# Altium footprint library Footprint.PcbLib: 14 footprints
Each footprint in its own frame and in the unit in brackets; x right, y up, seen from the top. Pads: shape width x height; smd on the part's side, far side on the other; paste and mask are expansions set on the pad; w line width, h text height; cw(c..) or ccw(c..) is an arc to the next point about the centre after c.
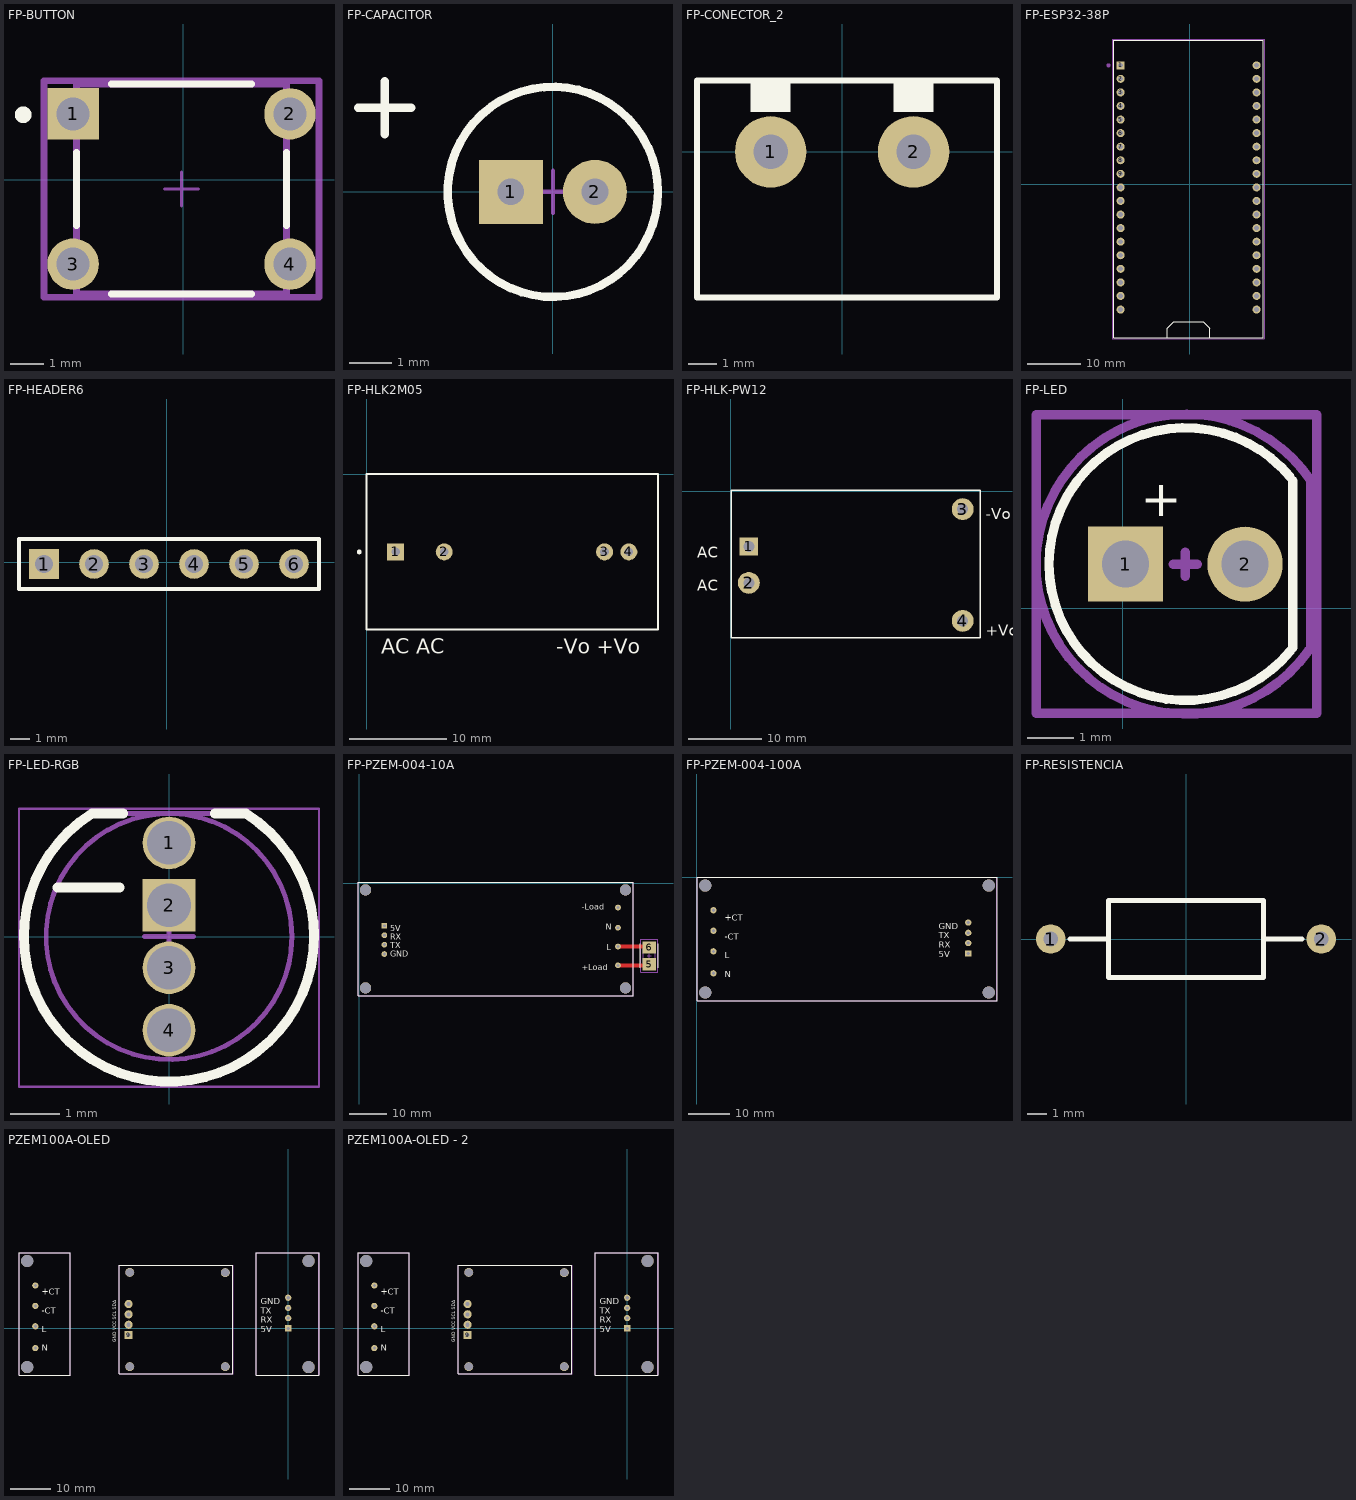
[diagram p0: the footprints below, top view; thin cyan lines are the x and y axes]

## FP-BUTTON [mm]
pads (4):
  rect 1.54x1.54 hole 0.99 paste-1000 mask+0: 1(-3.298,1.978)
  round 1.54 hole 0.99 paste-1000 mask+0: 2(3.202,1.978) 3(-3.298,-2.522) 4(3.202,-2.522)
Top Overlay:
  circle w0.25: c-4.793,1.953 r0.125
  lines w0.2: -3.193,-1.377 -3.193,0.833 ; -2.153,-3.417 2.057,-3.417 ; -2.153,2.873 2.057,2.873 ; 3.097,-1.377 3.097,0.833
Mechanical 5:
  lines w0.2: -4.168,-3.517 -4.168,2.973 4.072,2.973 4.072,-3.517 -4.168,-3.517
  text ".Designator" at -2.207,-0.084 h1
Mechanical 13:
  lines w0.2: -3.193,-3.417 -3.193,2.873 3.097,2.873 3.097,-3.417 -3.193,-3.417
Mechanical 15:
  lines w0.2: -4.168,-3.517 -4.168,2.973 4.072,2.973 4.072,-3.517 -4.168,-3.517
Mechanical 16:
  lines w0.1: -0.548,-0.272 0.452,-0.272 ; -0.048,-0.772 -0.048,0.228
3D body "Switch_TE_Connectivity_3-1825910-1_eec.STEP": height 0.25, standoff 0, extent -4.168,-3.517 4.072,2.973

## FP-CAPACITOR [mil]
pads (2):
  rect 60x60 hole 25: 1(-39.37,0)
  round 60 hole 25: 2(39.37,0)
Top Overlay:
  circle w7.87: c0,0 r98.43
  lines w7.87: -182.48,78.74 -132.48,78.74 ; -157.48,53.74 -157.48,103.74
Mechanical 13:
  circle w3.94: c0,0 r98.43
Mechanical 15:
  circle w1.97: c0,0 r98.43
  lines w3.94: -19.68,0 19.69,0 ; 0,-19.68 0,19.68
3D body "ElCapVT-2.0-5x7-black.step": height 275.63, standoff -118.11, extent -98.43,-98.41 98.46,98.41

## FP-CONECTOR_2 [mm]
pads (2):
  round 2.5 hole 1.2: 1(-2.5,0) 2(2.5,0)
Top Overlay:
  rectangle: 1.8,1.4 3.2,2.5
  rectangle: -3.2,1.4 -1.8,2.5
  lines w0.2: -5.08,-5.1 5.42,-5.1 5.42,2.5 -5.08,2.5 -5.08,-5.1
3D body "User Library-bornera-1.STEP": height 10, standoff -3.75, extent -5,-5.02 5.5,2.58

## FP-ESP32-38P [mm]
pads (38):
  rect 1.5x1.5 hole 0.9: 1(-12.967,22.255)
  round 1.5 hole 0.9: 2(-12.967,19.715) 3(-12.967,17.175) 4(-12.967,14.635) 5(-12.967,12.095) 6(-12.967,9.555) 7(-12.967,7.015) 8(-12.967,4.475) 9(-12.967,1.935) 10(-12.967,-0.605) 11(-12.967,-3.145) 12(-12.967,-5.685) 13(-12.967,-8.225) 14(-12.967,-10.765) 15(-12.967,-13.305) 16(-12.967,-15.845) 17(-12.967,-18.385) 18(-12.967,-20.925) 19(-12.967,-23.465) 20(12.483,-23.465) 21(12.483,-20.925) 22(12.483,-18.385) 23(12.483,-15.845) 24(12.483,-13.305) 25(12.483,-10.765) 26(12.483,-8.225) 27(12.483,-5.685) 28(12.483,-3.145) 29(12.483,-0.605) 30(12.483,1.935) 31(12.483,4.475) 32(12.483,7.015) 33(12.483,9.555) 34(12.483,12.095) 35(12.483,14.635) 36(12.483,17.175) 37(12.483,19.715) 38(12.483,22.255)
Top Overlay:
  lines w0.127: -14.22,-28.73 -14.22,26.94 ; -14.22,26.95 13.69,26.95 13.72,26.92 13.72,-28.73 ; -14.2,-28.73 13.7,-28.73 ; -4.25,-28.75 -4.25,-27 -3,-25.75 2.5,-25.75 3.75,-27 3.75,-28.75
Mechanical 13:
  circle w0.48: c-15.25,22.25 r0.14
Mechanical 15:
  lines w0.05: -14.47,-28.98 -14.47,27.17 13.93,27.17 ; -14.45,-28.98 13.95,-28.98 13.95,27.17
3D body "Goouuu-ESP32 Development Board.STEP": height 8.6, standoff -4.54, extent -14.22,-28.73 13.72,26.85

## FP-HEADER6 [mm]
pads (6):
  rect 1.5x1.5 hole 0.9: 1(-6.224,-0.096)
  round 1.5 hole 0.9: 2(-3.684,-0.096) 3(-1.144,-0.096) 4(1.396,-0.096) 5(3.936,-0.096) 6(6.476,-0.096)
Top Overlay:
  lines w0.2: -7.494,-1.366 -7.494,1.174 7.746,1.174 7.746,-1.366 -7.494,-1.366
3D body "female header.stp": height 5, standoff -3, extent -7.744,-1.366 7.996,1.134

## FP-HLK2M05 [mm]
pads (4):
  rect 1.75x1.75 hole 0.9: 1(3,-8)
  round 1.75 hole 0.9: 2(8,-8) 3(24.5,-8) 4(27,-8)
Top Overlay:
  circle w0.25: c-0.75,-8 r0.125
  lines w0.2: 0,-16 30,-16 30,0 0,0 0,-16
  text "AC AC" at 1.504,-18.496 h1.52
  text "-Vo +Vo" at 19.504,-18.496 h1.52
3D body "HLK-2M05.stp": height 19.1, standoff -5, extent 0,-16 30,0

## FP-HLK-PW12 [mm]
pads (4):
  rect 2.5x2.5 hole 1.5: 1(2.475,-7.55)
  round 3 hole 1.5: 2(2.475,-12.55) 3(31.775,-2.45) 4(31.775,-17.75)
Top Overlay:
  lines w0.2: 0.05,-20.05 34.175,-20.05 34.175,0.125 0.05,0.125 0.05,-20.05
  text "-Vo /  /  /  /  /  /  / +Vo" at 34.95,-19.8 h1.52
  text "AC /  / AC" at -4.625,-13.65 h1.52
3D body "User Library-HLK-PM01.STEP": height 15.6, standoff -4.5, extent 0.175,-20.15 34.175,0.05

## FP-LED [mm]
pads (2):
  rect 1.6x1.6 hole 1: 1(0.064,0.937)
  round 1.6 hole 1: 2(2.604,0.937)
Top Overlay:
  lines w0.2: -1.136,2.457 cw(c1.334,0.937) 3.562,2.794 ; -1.035,2.609 ccw(c1.334,0.937) 3.573,-0.907 ; 3.62,-0.841 3.62,2.715
  text "+" at 0.382,1.956 h0.76
Mechanical 13:
  lines w0.2: -1.841,-2.238 -1.841,4.112 4.128,4.112 4.128,-2.238 -1.841,-2.238
Mechanical 15:
  lines w0.2: 1.08,0.937 1.588,0.937 ; 1.334,0.683 1.334,1.191 ; 3.95,-0.909 cw(c1.348,0.94) 4.001,2.715 4.001,-0.841
  text ".Designator" at 1.334,0.937 h0.76
  text "+" at 0.382,1.956 h0.76
3D body "LED 5mm Green.step": height 8.72, standoff -2.98, extent -1.566,-1.963 3.834,3.837

## FP-LED-RGB [mm]
pads (4):
  round 1.07 hole 0.889 paste+0: 1(0,1.905) 3(0,-0.635) 4(0,-1.905)
  rect 1.07x1.07 hole 0.889 paste+0: 2(0,0.635)
Top Overlay:
  lines w0.2: -2.27,1 -1,1 ; -0.93,2.5 -1.566,2.5 ccw(c0,0) 1.566,2.5 0.93,2.5
Mechanical 13:
  circle w0.1: c0,0 r2.5
  lines w0.1: -1.566,2.5 ccw(c0,0) 1.566,2.5 -1.566,2.5
Mechanical 15:
  lines w0.05: -3.05,-3.05 -3.05,2.6 3.05,2.6 3.05,-3.05 -3.05,-3.05
  lines w0.1: -0.5,0 0.5,0 ; 0,-0.5 0,0.5
3D body "CA GRB LED 5mm.STEP": height 10.6, standoff -23.6, extent -2.75,-2.75 2.75,2.375

## FP-PZEM-004-10A [mm]
pads (14):
  rect 1.524x1.524 hole 0.762: 1(6.65,-11.25)
  round 1.524 hole 0.762: 2(6.65,-13.75) 3(6.65,-16.25) 4(6.65,-18.75) 5(68.65,-21.75) 6(68.65,-16.75) 7(68.65,-11.75) 8(68.65,-6.4)
  rect 3.535x3.264 smd paste+0 mask+0: 5(76.924,-21.446) 6(76.924,-17.004)
  round 3 hole 3: ""(1.65,-27.75) ""(1.65,-1.74) ""(70.65,-27.75) ""(70.65,-1.74)
Top Layer:
  lines w1: 68.65,-21.75 76.728,-21.75 ; 68.65,-16.75 76.17,-16.75
Top Overlay:
  lines w0.2: 74.574,-22.4 74.574,-16.05 ; 79.274,-22.4 79.274,-16.05 ; -0.35,-29.75 72.65,-29.75 72.65,0.25 -0.35,0.25 -0.35,-29.75
  text "5V / RX / TX / GND" at 8.15,-19.5 h1.52
  text "N" at 65.4,-12.25 h1.52
  text "L" at 65.65,-17.75 h1.52
  text "-Load" at 59,-7 h1.52
  text "+Load" at 59,-23 h1.52
Mechanical 5:
  lines w0.2: -0.35,-29.75 -0.35,0.25 72.65,0.25 72.65,-29.75 -0.35,-29.75 ; 74.657,-23.577 79.191,-23.577 79.191,-14.873 74.657,-14.873 74.657,-23.577
  text ".Designator" at 76.736,-19.225 h1
Mechanical 13:
  lines w0.2: 75.334,-22.4 78.514,-22.4 78.514,-16.05 75.334,-16.05 75.334,-22.4
Mechanical 15:
  lines w0.2: 74.657,-23.577 79.191,-23.577 79.191,-14.873 74.657,-14.873 74.657,-23.577
Mechanical 16:
  lines w0.1: 76.424,-19.225 77.424,-19.225 ; 76.924,-19.725 76.924,-18.725
3D body "Res_Yageo_PA2512FKM7W0R001E_eec.STEP": height 0.25, standoff 0, extent 74.657,-23.577 79.191,-14.873
3D body "PZEM-004T-100A)V3.0).step": height 12.04, standoff -3.96, extent -0.35,-29.75 72.65,0.25

## FP-PZEM-004-100A [mm]
pads (12):
  rect 1.524x1.524 hole 0.762: 1(66.05,-18.575)
  round 1.524 hole 0.762: 2(66.05,-16.075) 3(66.05,-13.575) 4(66.05,-11.075) 5(4.05,-8.075) 6(4.05,-13.075) 7(4.05,-18.075) 8(4.05,-23.425)
  round 3 hole 3: ""(2.05,-28.085) ""(2.05,-2.075) ""(71.05,-28.085) ""(71.05,-2.075)
Top Overlay:
  lines w0.2: 0.05,-30.075 73.05,-30.075 73.05,-0.075 0.05,-0.075 0.05,-30.075
  text "GND / TX / RX / 5V" at 58.9,-19.5 h1.52
  text "+CT /  / -CT /  / L /  / N" at 6.75,-24.35 h1.52
Mechanical 5:
  lines w0.2: 0.05,-30.075 0.05,-0.075 73.05,-0.075 73.05,-30.075 0.05,-30.075
3D body "PZEM-004T-V3.step": height 16.3, standoff 0, extent -0.575,-30 73.425,0

## FP-RESISTENCIA [mil]
pads (2):
  round 60 hole 30: 1(-275.59,0) 2(275.59,0)
Top Overlay:
  lines w10: -236.22,0 -157.48,0 ; 157.48,0 236.22,0 ; -157.48,-78.74 -157.48,78.74 157.48,78.74 157.48,-78.74 -157.48,-78.74
3D body "RES-1W.STEP": height 183.17, standoff -92.42, extent -291.34,-78.74 291.34,78.74

## PZEM100A-OLED [mm]
pads (20):
  rect 1.524x1.524 hole 0.762: 1(0,0)
  round 1.524 hole 0.762: 2(0,2.5) 3(0,5) 4(0,7.5) 5(-62,10.5) 6(-62,5.5) 7(-62,0.5) 8(-62,-4.85)
  rect 2x2 hole 1: 9(-39.115,-1.64)
  round 2 hole 1: 10(-39.115,0.885) 11(-39.115,3.435) 12(-39.115,5.96)
  round 3 hole 3: ""(-64,-9.51) ""(-64,16.5) ""(5,-9.51) ""(5,16.5)
  round 2.2 hole 2: ""(-38.84,-9.39) ""(-38.84,13.71) ""(-15.415,-9.39) ""(-15.415,13.66)
Top Overlay:
  lines w0.2: -66,-11.5 -66,18.5 ; -53.4,-11.45 -53.4,18.55 ; -7.85,-11.5 -7.85,18.5 ; 7.55,-11.525 7.55,18.475 ; -41.42,-11.19 -41.42,15.51 -13.56,15.51 -13.56,-11.19 -41.42,-11.19
  lines w0.254: -66,-11.5 -53.45,-11.5 ; -66,18.5 -53.45,18.5 ; -7.85,-11.5 7.525,-11.5 ; -7.85,18.5 7.525,18.5
  text "+CT /  / -CT /  / L /  / N" at -60.45,-5.525 h1.52
  text "GND VCC SCL SDA" at -42.144,-3.411 h0.8
  text "GND / TX / RX / 5V" at -6.775,-0.95 h1.52
Mechanical 5:
  lines w0.2: -66,-11.5 -66,18.5 ; -53.4,-11.45 -53.4,18.55 ; -7.85,-11.5 -7.85,18.5 ; 7.55,-11.525 7.55,18.475
Mechanical 13:
  lines w0.254: -66,18.5 -66,-11.5 -66,-11.5 -53.45,-11.5 -53.4,-11.45 -53.4,18.55 -53.45,18.5 -65.75,18.5 ; 7.525,-11.5 -7.85,-11.5 -7.85,18.5 7.525,18.5 ; 7.55,-11.525 7.55,18.475 ; -41.42,-11.19 -41.42,15.51 -13.56,15.51 -13.5,15.45 -13.5,-11.13 -13.56,-11.19 -41.42,-11.19 ; -41.42,-11.19 -41.42,-11.19
3D body "OLED 128x64.STP": height 4.77, standoff -6.07, extent -41.42,-11.19 -13.56,15.51

## PZEM100A-OLED - 2 [mm]
pads (20):
  rect 1.524x1.524 hole 0.762: 1(0,0)
  round 1.524 hole 0.762: 2(0,2.5) 3(0,5) 4(0,7.5) 5(-62,10.5) 6(-62,5.5) 7(-62,0.5) 8(-62,-4.85)
  rect 2x2 hole 1: 9(-39.115,-1.64)
  round 2 hole 1: 10(-39.115,0.885) 11(-39.115,3.435) 12(-39.115,5.96)
  round 3 hole 3: ""(-64,-9.51) ""(-64,16.5) ""(5,-9.51) ""(5,16.5)
  round 2.2 hole 2: ""(-38.84,-9.39) ""(-38.84,13.71) ""(-15.415,-9.39) ""(-15.415,13.66)
Top Overlay:
  lines w0.2: -66,-11.5 -66,18.5 ; -53.4,-11.45 -53.4,18.55 ; -7.85,-11.5 -7.85,18.5 ; 7.55,-11.525 7.55,18.475 ; -41.42,-11.19 -13.56,-11.19 -13.56,15.51 -41.42,15.51 -41.42,-11.19
  lines w0.254: -66,-11.5 -53.45,-11.5 ; -66,18.5 -53.45,18.5 ; -7.85,-11.5 7.525,-11.5 ; -7.85,18.5 7.525,18.5
  text "GND / TX / RX / 5V" at -6.775,-0.95 h1.52
  text "GND VCC SCL SDA" at -42.144,-3.411 h0.8
  text "+CT /  / -CT /  / L /  / N" at -60.45,-5.525 h1.52
Mechanical 5:
  lines w0.2: -66,-11.5 -66,18.5 ; -53.4,-11.45 -53.4,18.55 ; -7.85,-11.5 -7.85,18.5 ; 7.55,-11.525 7.55,18.475
Mechanical 13:
  lines w0.254: -66,18.5 -66,-11.5 -66,-11.5 -53.45,-11.5 -53.4,-11.45 -53.4,18.55 -53.45,18.5 -65.75,18.5 ; 7.525,-11.5 -7.85,-11.5 -7.85,18.5 7.525,18.5 ; 7.55,-11.525 7.55,18.475 ; -41.42,-11.19 -13.56,-11.19 -13.5,-11.13 -13.5,15.45 -13.56,15.51 -41.42,15.51 -41.42,-11.19 ; -41.42,-11.19 -41.42,-11.19
3D body "PZEM-004T-V3.step": height 16.3, standoff 0, extent -66.075,-11.475 7.925,18.525